# Altium footprint library DrPCB.PcbLib: 910 footprints (part 16 of 57)
Each footprint in its own frame and in the unit in brackets; x right, y up, seen from the top. Pads: shape width x height; smd on the part's side, far side on the other; paste and mask are expansions set on the pad; w line width, h text height; cw(c..) or ccw(c..) is an arc to the next point about the centre after c.
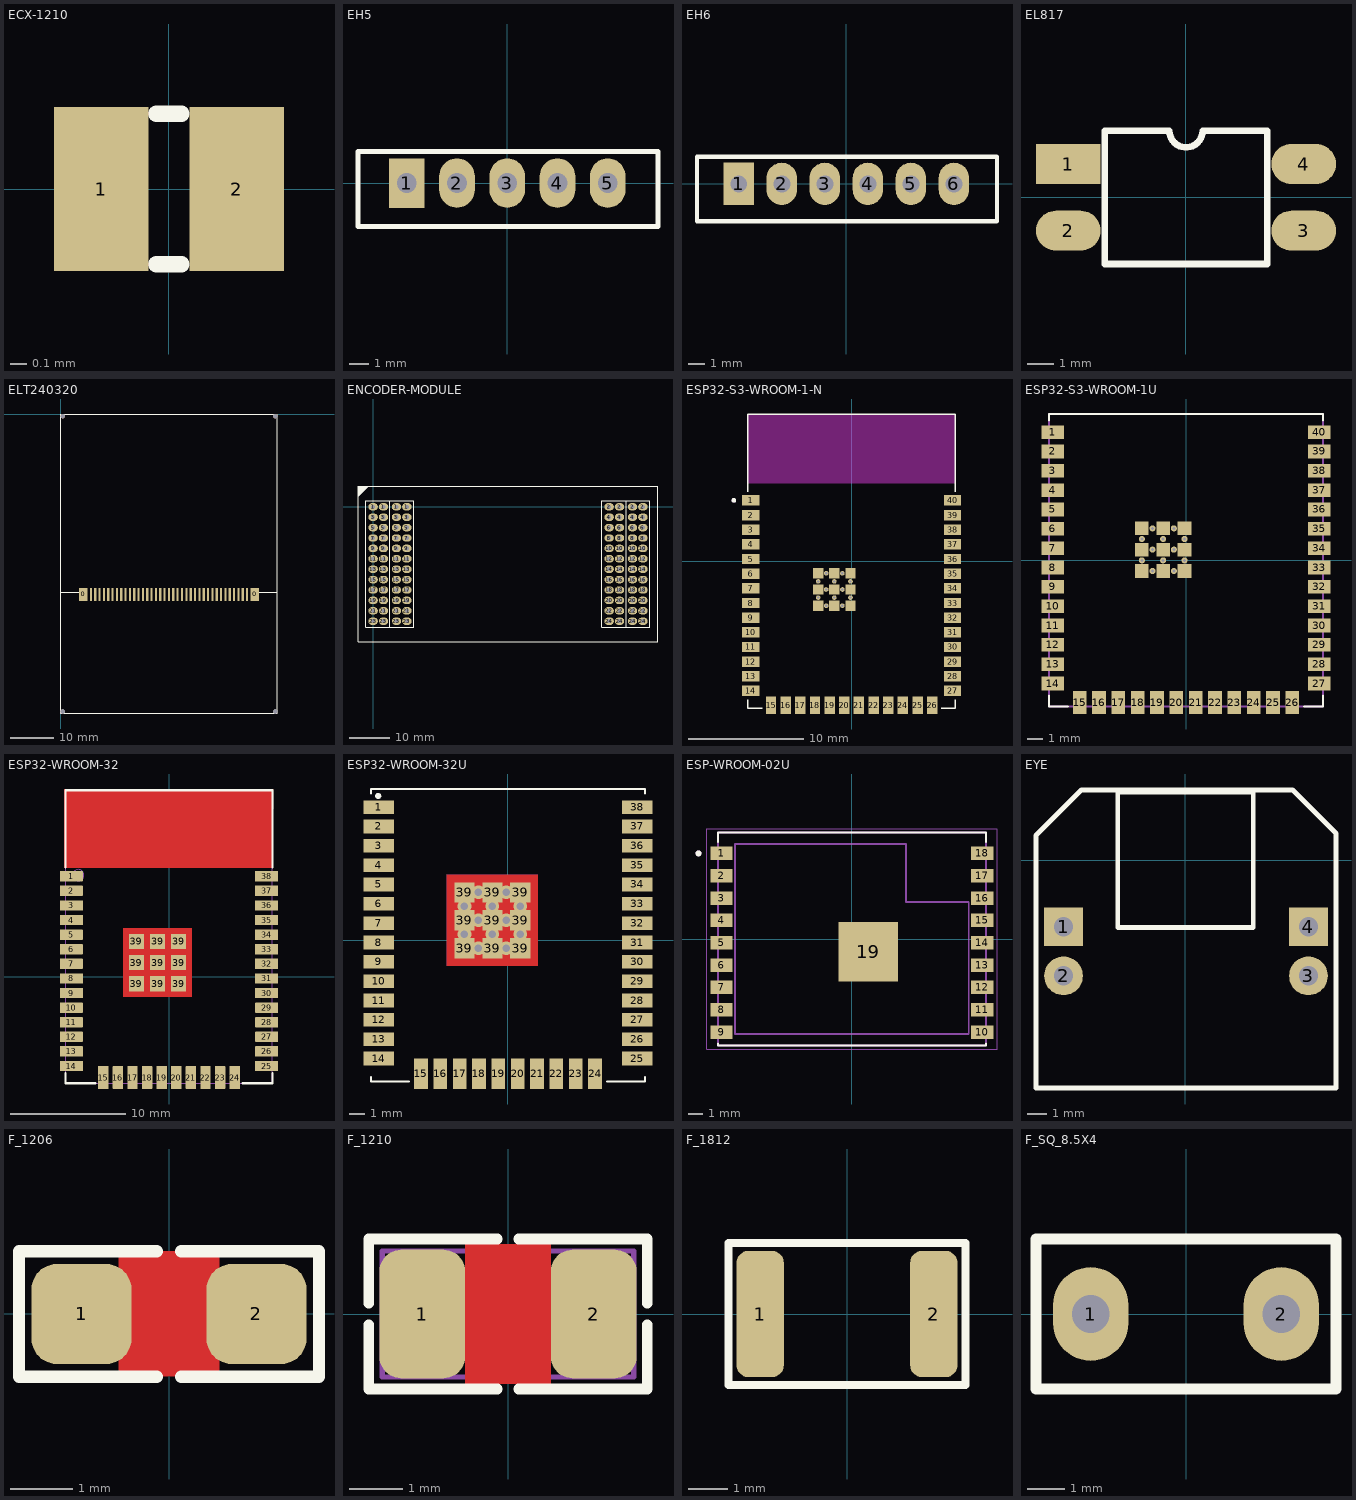
[diagram p15: the footprints below, top view; thin cyan lines are the x and y axes]

## ECX-1210 [mm]
pads (2):
  rect 0.575x1 smd: 1(-0.413,0) 2(0.413,0)
Top Overlay:
  lines w0.1: -0.076,-0.457 0.076,-0.457 ; -0.076,0.457 0.076,0.457
3D body "ECS-.327-12.5-1210-TR--3DModel-STEP-40055.STEP": height 0.36, standoff 0.01, extent -0.6,-0.5 0.6,0.5

## EH5 [mm]
pads (5):
  rect 1.8x2.5 hole 1: 1(-5.08,0)
  oval 1.8x2.5 hole 1: 2(-2.54,0) 3(0,0) 4(2.54,0) 5(5.08,0)
Top Overlay:
  lines w0.254: 7.607,-2.2 -7.544,-2.2 -7.544,1.6 7.607,1.6 ; 7.62,-2.172 7.62,1.575
3D body "User Library-CON_BxxBEHA.step": height 6, standoff -3.2, extent -7.5,-2.205 7.5,1.595

## EH6 [mm]
pads (6):
  rect 1.8x2.5 hole 1: 1(-6.35,0)
  oval 1.8x2.5 hole 1: 2(-3.81,0) 3(-1.27,0) 4(1.27,0) 5(3.81,0) 6(6.35,0)
Top Overlay:
  lines w0.254: 8.877,-2.2 -8.814,-2.2 -8.814,1.6 8.877,1.6 ; 8.89,-2.172 8.89,1.575
3D body "User Library-CON_BxxBEHA (1).step": height 6, standoff -3.2, extent -8.75,-2.222 8.75,1.578

## EL817 [mm]
pads (4):
  rect 2.465x1.524 smd: 1(-4.483,1.27)
  oval 2.465x1.524 smd: 2(-4.483,-1.27) 3(4.483,-1.27) 4(4.483,1.27)
Top Overlay:
  lines w0.254: -3.1,-2.54 -3.1,2.54 -0.635,2.54 ccw(c0,2.54) 0.635,2.54 3.1,2.54 3.1,-2.54 -3.1,-2.54

## ELT240320 [mm]
pads (43):
  round 1 hole 1.1: 0(0.4,-68.502) 0(49.4,-68.502)
  round 1 hole 1: 0(0.4,-0.4) 0(49.4,-0.4)
  rect 2x3 smd: 0(5.146,-41.5) 0(44.646,-41.5)
  rect 0.5x3 smd: 1(6.896,-41.5) 2(7.896,-41.5) 3(8.896,-41.5) 4(9.896,-41.5) 5(10.896,-41.5) 6(11.896,-41.5) 7(12.896,-41.5) 8(13.896,-41.5) 9(14.896,-41.5) 10(15.896,-41.5) 11(16.896,-41.5) 12(17.896,-41.5) 13(18.896,-41.5) 14(19.896,-41.5) 15(20.896,-41.5) 16(21.896,-41.5) 17(22.896,-41.5) 18(23.896,-41.5) 19(24.896,-41.5) 20(25.896,-41.5) 21(26.896,-41.5) 22(27.896,-41.5) 23(28.896,-41.5) 24(29.896,-41.5) 25(30.896,-41.5) 26(31.896,-41.5) 27(32.896,-41.5) 28(33.896,-41.5) 29(34.896,-41.5) 30(35.896,-41.5) 31(36.896,-41.5) 32(37.896,-41.5) 33(38.896,-41.5) 34(39.896,-41.5) 35(40.896,-41.5) 36(41.896,-41.5) 37(42.896,-41.5)
Top Overlay:
  lines w0.254: 0,-41 4.102,-41 ; 45.695,-41 49.775,-41 ; 0,-68.91 49.8,-68.91 49.8,0 0,0 0,-68.91

## ENCODER-MODULE [mm]
pads (96):
  oval 2.3x1.8 hole 1: 1(0,0) 1(2.54,0) 1(5.715,0) 1(8.255,0) 2(57.645,0) 2(60.198,0) 2(63.373,0) 2(65.913,0) 3(0,-2.54) 3(2.54,-2.54) 3(5.715,-2.54) 3(8.255,-2.54) 4(57.658,-2.54) 4(60.198,-2.54) 4(63.373,-2.54) 4(65.913,-2.54) 5(0,-5.08) 5(2.54,-5.08) 5(5.715,-5.08) 5(8.255,-5.08) 6(57.658,-5.08) 6(60.198,-5.08) 6(63.373,-5.08) 6(65.913,-5.08) 7(0,-7.62) 7(2.54,-7.62) 7(5.715,-7.62) 7(8.255,-7.62) 8(57.658,-7.62) 8(60.198,-7.62) 8(63.373,-7.62) 8(65.913,-7.62) 9(0,-10.16) 9(2.54,-10.16) 9(5.715,-10.16) 9(8.255,-10.16) 10(57.658,-10.16) 10(60.198,-10.16) 10(63.373,-10.16) 10(65.913,-10.16) 11(0,-12.7) 11(2.54,-12.7) 11(5.715,-12.7) 11(8.255,-12.7) 12(57.658,-12.7) 12(60.198,-12.7) 12(63.373,-12.7) 12(65.913,-12.7) 13(0,-15.24) 13(2.54,-15.24) 13(5.715,-15.24) 13(8.255,-15.24) 14(57.658,-15.24) 14(60.198,-15.24) 14(63.373,-15.24) 14(65.913,-15.24) 15(0,-17.78) 15(2.54,-17.78) 15(5.715,-17.78) 15(8.255,-17.78) 16(57.658,-17.78) 16(60.198,-17.78) 16(63.373,-17.78) 16(65.913,-17.78) 17(0,-20.32) 17(2.54,-20.32) 17(5.715,-20.32) 17(8.255,-20.32) 18(57.658,-20.32) 18(60.198,-20.32) 18(63.373,-20.32) 18(65.913,-20.32) 19(0,-22.86) 19(2.54,-22.86) 19(5.715,-22.86) 19(8.255,-22.86) 20(57.658,-22.86) 20(60.198,-22.86) 20(63.373,-22.86) 20(65.913,-22.86) 21(0,-25.4) 21(2.54,-25.4) 21(5.715,-25.4) 21(8.255,-25.4) 22(57.658,-25.4) 22(60.198,-25.4) 22(63.373,-25.4) 22(65.913,-25.4) 23(0,-27.94) 23(2.54,-27.94) 23(5.715,-27.94) 23(8.255,-27.94) 24(57.658,-27.94) 24(60.198,-27.94) 24(63.373,-27.94) 24(65.913,-27.94)
Top Overlay:
  lines w0.254: -3.645,5.067 -0.025,5.067 ; -3.626,2.597 -1.156,5.067 -1.359,5.067 -3.645,2.781 -3.645,3.124 -1.702,5.067 -2.083,5.067 -3.645,3.505 -2.921,3.505 -1.808,4.618 -1.808,4.881 -2.408,4.881 ; -3.429,5.029 -3.429,4.699 -3.061,5.067 -2.883,5.067 -3.645,4.305 -3.645,3.988 -2.751,4.881 -2.408,4.881 ; -2.921,3.823 -2.114,4.63 -1.808,4.63 -1.847,4.669 -2.353,4.669 -2.417,4.733 -2.417,4.674 -2.422,4.678 ; -2.691,4.189 -2.957,3.923 -2.957,3.541 -2.447,4.051 -2.615,4.051 -2.598,4.068 -2.598,4.424 -3.11,3.912 -3.11,4.179 -3.454,3.835 -2.408,4.881 ; -2.3,4.127 -1.577,4.849 ; 4.127,-29.464 4.127,1.524 ; 61.785,-29.464 61.785,1.524 ; -2.759,4.118 -2.876,4.001 -2.876,3.868 -3.2,3.543 -3.2,3.95 -3.227,3.923 -2.984,4.166 -2.603,4.166 -2.422,4.347 ; -2.759,4.118 -2.759,4.01 -3.036,3.733 -2.422,4.347 ; -2.759,4.118 -2.754,4.113 -2.754,4.396 -2.447,4.703 -2.422,4.678 ; -2.759,4.118 -2.759,4.531 -2.408,4.881 ; -2.422,4.347 -2.422,4.678 ; -2.422,4.347 -2.422,4.678 ; -3.683,-33.02 69.596,-33.02 69.596,5.08 -3.683,5.08 -3.683,-33.02 ; -1.778,-29.464 -1.778,1.524 9.97,1.524 9.97,-29.464 -1.778,-29.464 ; 55.88,-29.464 67.627,-29.464 67.627,1.524 55.88,1.524 55.88,-29.464

## ESP32-S3-WROOM-1-N [mm]
pads (61):
  rect 1.5x0.9 smd: 1(-8.75,5.26) 2(-8.75,3.99) 3(-8.75,2.72) 4(-8.75,1.45) 5(-8.75,0.18) 6(-8.75,-1.09) 7(-8.75,-2.36) 8(-8.75,-3.63) 9(-8.75,-4.9) 10(-8.75,-6.17) 11(-8.75,-7.44) 12(-8.75,-8.71) 13(-8.75,-9.98) 14(-8.75,-11.25) 27(8.75,-11.25) 28(8.75,-9.98) 29(8.75,-8.71) 30(8.75,-7.44) 31(8.75,-6.17) 32(8.75,-4.9) 33(8.75,-3.63) 34(8.75,-2.36) 35(8.75,-1.09) 36(8.75,0.18) 37(8.75,1.45) 38(8.75,2.72) 39(8.75,3.99) 40(8.75,5.26)
  rect 0.9x1.5 smd: 15(-6.985,-12.5) 16(-5.715,-12.5) 17(-4.445,-12.5) 18(-3.175,-12.5) 19(-1.905,-12.5) 20(-0.635,-12.5) 21(0.635,-12.5) 22(1.905,-12.5) 23(3.175,-12.5) 24(4.445,-12.5) 25(5.715,-12.5) 26(6.985,-12.5)
  rect 0.9x0.9 smd: 41_1(-1.5,-2.46) 41_2(-2.9,-2.46) 41_3(-0.1,-2.46) 41_4(-2.9,-3.86) 41_5(-1.5,-3.86) 41_6(-0.1,-3.86) 41_7(-2.9,-1.06) 41_8(-1.5,-1.06) 41_9(-0.1,-1.06)
  round 0.4 hole 0.2 mask+0: 41_10(-1.5,-1.76) 41_11(-2.9,-1.76) 41_12(-0.1,-1.76) 41_13(-2.9,-3.16) 41_14(-1.5,-3.16) 41_15(-0.1,-3.16) 41_16(-2.2,-1.06) 41_17(-0.8,-1.06) 41_18(-2.2,-2.46) 41_19(-0.8,-2.46) 41_20(-2.2,-3.86) 41_21(-0.8,-3.86)
Top Overlay:
  circle w0.2: c-10.2,5.26 r0.1
  lines w0.127: -9,-12.02 -9,-12.75 -7.755,-12.75 ; -9,6.03 -9,12.75 9,12.75 9,6.03 ; 7.755,-12.75 9,-12.75 9,-12.02
Keep-Out Layer:
  region: 9,6.75 -9,6.75 -9,12.75 9,12.75
  region: 9,6.75 -9,6.75 -9,12.75 9,12.75
Mechanical 13:
  circle w0.2: c-10.2,5.26 r0.1
  text "ANTENNA" at -4.5,9.5 h1.27
3D body "ESP32-S3-WROOM.step": height 3.17, standoff 0.01, extent -9.01,-12.76 9.01,12.75

## ESP32-S3-WROOM-1U [mm]
height 3.35
pads (61):
  rect 1.5x0.9 smd: 1(-8.75,8.41) 2(-8.75,7.14) 3(-8.75,5.87) 4(-8.75,4.6) 5(-8.75,3.33) 6(-8.75,2.06) 7(-8.75,0.79) 8(-8.75,-0.48) 9(-8.75,-1.75) 10(-8.75,-3.02) 11(-8.75,-4.29) 12(-8.75,-5.56) 13(-8.75,-6.83) 14(-8.75,-8.1) 27(8.75,-8.1) 28(8.75,-6.83) 29(8.75,-5.56) 30(8.75,-4.29) 31(8.75,-3.02) 32(8.75,-1.75) 33(8.75,-0.48) 34(8.75,0.79) 35(8.75,2.06) 36(8.75,3.33) 37(8.75,4.6) 38(8.75,5.87) 39(8.75,7.14) 40(8.75,8.41)
  rect 0.9x1.5 smd: 15(-6.985,-9.35) 16(-5.715,-9.35) 17(-4.445,-9.35) 18(-3.175,-9.35) 19(-1.905,-9.35) 20(-0.635,-9.35) 21(0.635,-9.35) 22(1.905,-9.35) 23(3.175,-9.35) 24(4.445,-9.35) 25(5.715,-9.35) 26(6.985,-9.35)
  rect 0.9x0.9 smd: 41_1(-2.9,2.09) 41_2(-1.5,2.09) 41_3(-0.1,2.09) 41_4(-2.9,0.69) 41_5(-1.5,0.69) 41_6(-0.1,0.69) 41_7(-2.9,-0.71) 41_8(-1.5,-0.71) 41_9(-0.1,-0.71)
  round 0.4 hole 0.2 mask+0: 41_10(-2.2,2.09) 41_11(-0.8,2.09) 41_12(-2.9,1.39) 41_13(-1.5,1.39) 41_14(-0.1,1.39) 41_15(-2.2,0.69) 41_16(-0.8,0.69) 41_17(-2.9,-0.01) 41_18(-1.5,-0.01) 41_19(-0.1,-0.01) 41_20(-2.2,-0.71) 41_21(-0.8,-0.71)
Top Overlay:
  lines w0.127: -9,-8.87 -9,-9.6 -7.755,-9.6 ; -9,9.18 -9,9.6 9,9.6 9,9.18 ; 7.755,-9.6 9,-9.6 9,-8.87
Mechanical 13:
  lines w0.127: -9,-9.6 9,-9.6 9,9.6 -9,9.6 -9,-9.6
3D body "step_temp.STEP": height 3.35, standoff 0, extent -9,-9.6 9,9.6

## ESP32-WROOM-32 [mm]
pads (47):
  rrect10% 2x0.9 smd paste+0 mask+0.05: 1(-8.5,8.755) 2(-8.5,7.485) 3(-8.5,6.215) 4(-8.5,4.945) 5(-8.5,3.675) 6(-8.5,2.405) 7(-8.5,1.135) 8(-8.5,-0.135) 9(-8.5,-1.405) 10(-8.5,-2.675) 11(-8.5,-3.945) 12(-8.5,-5.215) 13(-8.5,-6.485) 14(-8.5,-7.755) 25(8.5,-7.755) 26(8.5,-6.485) 27(8.5,-5.215) 28(8.5,-3.945) 29(8.5,-2.675) 30(8.5,-1.405)
  rrect10% 0.9x2 smd paste+0 mask+0.05: 15(-5.715,-8.755) 16(-4.445,-8.755) 17(-3.175,-8.755) 18(-1.905,-8.755) 19(-0.635,-8.755) 20(0.635,-8.755) 21(1.905,-8.755) 22(3.175,-8.755) 23(4.445,-8.755) 24(5.715,-8.755)
  rect 2x0.9 smd paste+0 mask+0.05: 31(8.5,-0.135) 32(8.5,1.135) 33(8.5,2.405) 34(8.5,3.675) 35(8.5,4.945) 36(8.5,6.215) 37(8.5,7.485) 38(8.5,8.755)
  rect 1.33x1.33 smd paste+0 mask+0.05: 39(-2.835,-0.59) 39(-2.835,1.245) 39(-2.835,3.08) 39(-1,1.245) 39(-1,-0.59) 39(-1,3.08) 39(0.835,-0.59) 39(0.835,1.245) 39(0.835,3.08)
Top Layer:
  rectangle: -4,-1.755 2,4.245
  pour cut-out: 9.004,9.5 -9.093,9.5 -9.093,16.345 9.08,16.345
Top Overlay:
  lines w0.2: -9,-8.355 -9,-9.255 -6.4,-9.255 ; -9,9.545 -9,16.245 9,16.245 9,9.545 ; 6.4,-9.255 9,-9.255 9,-8.355
Mechanical 13:
  circle w0.1: c-7.9,8.845 r0.5
  lines w0.1: -9,-9.255 -9,16.245 9,16.245 9,-9.255 -9,-9.255
3D body "User Library-ESP32-WROOM.step": height 2.91, standoff -0.01, extent -9,-9.257 9,16.243

## ESP32-WROOM-32U [mm]
pads (47):
  rect 2x0.9 smd: 1(-8.5,8.755) 2(-8.5,7.485) 3(-8.5,6.215) 4(-8.5,4.945) 5(-8.5,3.675) 6(-8.5,2.405) 7(-8.5,1.135) 8(-8.5,-0.135) 9(-8.5,-1.405) 10(-8.5,-2.675) 11(-8.5,-3.945) 12(-8.5,-5.215) 13(-8.5,-6.485) 14(-8.5,-7.755) 25(8.5,-7.755) 26(8.5,-6.485) 27(8.5,-5.215) 28(8.5,-3.945) 29(8.5,-2.675) 30(8.5,-1.405) 31(8.5,-0.135) 32(8.5,1.135) 33(8.5,2.405) 34(8.5,3.675) 35(8.5,4.945) 36(8.5,6.215) 37(8.5,7.485) 38(8.5,8.755)
  rect 0.9x2 smd: 15(-5.715,-8.755) 16(-4.445,-8.755) 17(-3.175,-8.755) 18(-1.905,-8.755) 19(-0.635,-8.755) 20(0.635,-8.755) 21(1.905,-8.755) 22(3.175,-8.755) 23(4.445,-8.755) 24(5.715,-8.755)
  rect 1.33x1.33 smd paste+0 mask+0.05: 39(-2.86,-0.514) 39(-2.86,1.321) 39(-2.86,3.156) 39(-1.025,1.321) 39(-1.025,-0.514) 39(-1.025,3.156) 39(0.81,-0.514) 39(0.81,1.321) 39(0.81,3.156)
via 0.81,2.239 diameter 0.9 hole 0.5
via 0.81,0.404 diameter 0.9 hole 0.5
via -1.025,2.239 diameter 0.9 hole 0.5
via -1.025,0.404 diameter 0.9 hole 0.5
via -2.86,2.239 diameter 0.9 hole 0.5
via -2.86,0.404 diameter 0.9 hole 0.5
via -0.108,-0.514 diameter 0.9 hole 0.5
via -1.943,-0.514 diameter 0.9 hole 0.5
via -0.108,1.321 diameter 0.9 hole 0.5
via -0.108,3.156 diameter 0.9 hole 0.5
via -1.943,3.156 diameter 0.9 hole 0.5
via -1.943,1.321 diameter 0.9 hole 0.5
Top Layer:
  rectangle: -4.025,-1.679 1.975,4.321
Bottom Layer:
  rectangle: -4.025,-1.679 1.975,4.321
Top Overlay:
  lines w0.127: -9,-8.955 -9,-9.255 -6.49,-9.255 ; -9,9.645 -9,9.945 9,9.945 9,9.645 ; 6.49,-9.255 9,-9.255 9,-8.955
  lines w0.2: -8.422,9.499 ccw(c-8.522,9.487) -8.422,9.487
3D body "ESP32-WROOM-32U--3DModel-STEP-56544.STEP": height 3.3, standoff 0, extent -9,-9.244 9,9.956

## ESP-WROOM-02U [mm]
pads (19):
  rect 1.5x0.9 smd: 1(-8.75,5.75) 2(-8.75,4.25) 3(-8.75,2.75) 4(-8.75,1.25) 5(-8.75,-0.25) 6(-8.75,-1.75) 7(-8.75,-3.25) 8(-8.75,-4.75) 9(-8.75,-6.25) 10(8.75,-6.25) 11(8.75,-4.75) 12(8.75,-3.25) 13(8.75,-1.75) 14(8.75,-0.25) 15(8.75,1.25) 16(8.75,2.75) 17(8.75,4.25) 18(8.75,5.75)
  rect 4x4 smd paste-0.735: 19(1.1,-0.86)
Top Overlay:
  circle w0.2: c-10.3,5.75 r0.1
  lines w0.127: -9,-7.02 -9,-7.15 ; -9,6.52 -9,7.15 ; 9,-7.02 9,-7.15 ; 9,6.52 9,7.15 ; -9,-7.15 9,-7.15 ; -9,-7.15 9,-7.15 ; -9,7.15 9,7.15 ; -9,7.15 9,7.15
Mechanical 13:
  circle w0.2: c-10.3,5.75 r0.1
  lines w0.127: -9,-7.15 9,-7.15 9,7.15 -9,7.15 -9,-7.15 ; -7.85,-6.375 7.85,-6.375 7.85,2.475 3.65,2.475 3.65,6.375 -7.85,6.375 -7.85,-6.375
Mechanical 15:
  lines w0.05: -9.75,-7.4 -9.75,7.4 9.75,7.4 9.75,-7.4 -9.75,-7.4
3D body "step_temp.STEP": height 3.3, standoff 0, extent -9,-7.15 9,7.15

## EYE [mm]
pads (4):
  rect 2x2 hole 1: 1(-6.274,-3.442) 4(6.375,-3.442)
  round 2 hole 1: 2(-6.274,-5.982) 3(6.375,-5.982)
Top Overlay:
  lines w0.254: -7.696,-11.773 7.798,-11.773 7.798,1.384 5.563,3.619 -5.359,3.619 -7.696,1.283 -7.696,-11.773 ; -3.475,-3.487 3.525,-3.487 3.525,3.513 -3.475,3.513 -3.475,-3.487

## F_1206 [mm] "FUSE, 1206, 3.2x1.6mm"
height 2.5
pads (2):
  rrect50% 1.6x1.6 smd paste-2 mask+0.075: 1(-1.4,0) 2(1.4,0)
Top Layer:
  pour cut-out: -0.8,1 -0.8,-1 0.8,-1 0.8,1
Top Overlay:
  lines w0.2: -2.4,-1 -0.2,-1 ; -2.4,-1 -2.4,1 -0.2,1 ; 0.2,-1 2.4,-1 ; 0.2,1 2.4,1 2.4,-1
Top Paste:
  region: -1.4,0.7
  region: -1.4,0.7
  region: -1.4,0.7
  region: -1.15,0.7 -1.1,0.7 -1.008,0.662 -0.938,0.592 -0.9,0.5 -0.9,0.45 -0.9,-0.45 -0.9,-0.5 -0.938,-0.592 -1.008,-0.662 -1.1,-0.7 -1.15,-0.7 -1.625,-0.7 -1.68,-0.7 -1.781,-0.658 -1.858,-0.581 -1.9,-0.48 -1.9,-0.425 -1.9,0.45 -1.9,0.5 -1.862,0.592 -1.792,0.662 -1.7,0.7 -1.65,0.7
  region: 1.15,0.7 1.1,0.7 1.008,0.662 0.938,0.592 0.9,0.5 0.9,0.45 0.9,-0.45 0.9,-0.5 0.938,-0.592 1.008,-0.662 1.1,-0.7 1.15,-0.7 1.625,-0.7 1.68,-0.7 1.781,-0.658 1.858,-0.581 1.9,-0.48 1.9,-0.425 1.9,0.45 1.9,0.5 1.862,0.592 1.792,0.662 1.7,0.7 1.65,0.7
  region: 1.4,0.7
  region: 1.4,0.7
  region: 1.4,0.7
3D body "User Library-FUSER_nanoSMD.step": height 1, standoff 0, extent -1.603,-0.8 1.602,0.8

## F_1210 [mm] "FUSE, 1210, 3.2x2.5mm"
height 2.5
pads (2):
  rrect50% 1.6x2.4 smd paste-0.2 mask+0.075: 1(-1.6,0) 2(1.6,0)
Top Layer:
  pour cut-out: -0.8,1.3 -0.8,-1.3 0.8,-1.3 0.8,1.3
Top Overlay:
  lines w0.2: -2.6,-0.2 -2.6,-1.4 -0.2,-1.4 ; -2.6,0.2 -2.6,1.4 -0.2,1.4 ; 0.2,-1.4 2.6,-1.4 2.6,-0.2 ; 0.2,1.4 2.6,1.4 2.6,0.2
Mechanical 15:
  lines w0.1: -0.5,0 0.5,0 ; 0,-0.5 0,0.5 ; -2.35,-1.175 2.35,-1.175 2.35,1.175 -2.35,1.175 -2.35,-1.175
3D body "ALSRobot-Fuse1210.step": height 0.67, standoff 0, extent -1.607,-1.287 1.608,1.288

## F_1812 [mm] "FUSE, 4.50x3.20mm"
height 2.5
pads (2):
  rrect50% 1.2x3.2 smd paste-0.1 mask+0.1: 1(-2.2,0) 2(2.2,0)
Top Overlay:
  lines w0.2: -3,-1.8 -3,1.8 3,1.8 3,-1.8 -3,-1.8
3D body "User Library-Fuse 1812.step": height 1.03, standoff 0, extent -2.365,-1.74 2.37,1.74

## F_SQ_8.5X4 [mm]
pads (2):
  oval 2x2.5 hole 1: 1(-2.54,0) 2(2.54,0)
Top Overlay:
  lines w0.3: -4,-2 4,-2 4,2 -4,2 -4,-2
3D body: height 8, standoff 0, extent -4.013,-1.994 3.988,1.981